# Altium footprint library Connectors.PcbLib: 87 footprints (part 6 of 6)
Each footprint in its own frame and in the unit in brackets; x right, y up, seen from the top. Pads: shape width x height; smd on the part's side, far side on the other; paste and mask are expansions set on the pad; w line width, h text height; cw(c..) or ccw(c..) is an arc to the next point about the centre after c.
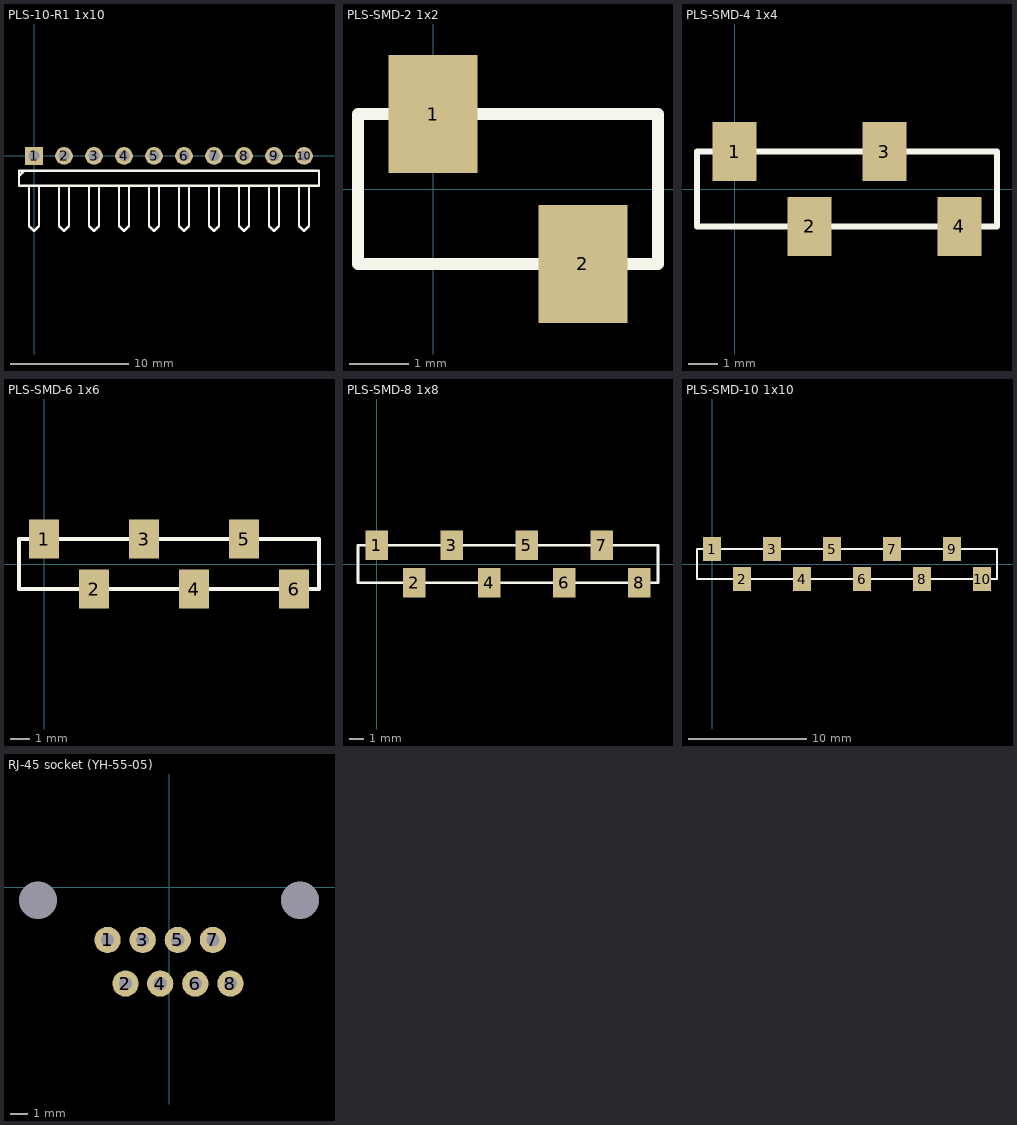
[diagram p5: the footprints below, top view; thin cyan lines are the x and y axes]

## PLS-10-R1 1x10 [mm]
pads (10):
  rect 1.5x1.5 hole 0.9: 1(0,0)
  round 1.5 hole 0.9: 2(2.54,0) 3(5.08,0) 4(7.62,0) 5(10.16,0) 6(12.7,0) 7(15.24,0) 8(17.78,0) 9(20.32,0) 10(22.86,0)
Top Overlay:
  lines w0.2: -1.27,-1.693 -0.847,-1.27 ; -0.423,-2.54 -0.423,-5.927 0,-6.35 0.423,-5.927 0.423,-2.54 ; 2.117,-2.54 2.117,-5.927 2.54,-6.35 2.963,-5.927 2.963,-2.54 ; 4.657,-2.54 4.657,-5.927 5.08,-6.35 5.503,-5.927 5.503,-2.54 ; 7.197,-2.54 7.197,-5.927 7.62,-6.35 8.043,-5.927 8.043,-2.54 ; 9.737,-2.54 9.737,-5.927 10.16,-6.35 10.583,-5.927 10.583,-2.54 ; 12.277,-2.54 12.277,-5.927 12.7,-6.35 13.123,-5.927 13.123,-2.54 ; 14.817,-2.54 14.817,-5.927 15.24,-6.35 15.663,-5.927 15.663,-2.54 ; 17.357,-2.54 17.357,-5.927 17.78,-6.35 18.203,-5.927 18.203,-2.54 ; 19.897,-2.54 19.897,-5.927 20.32,-6.35 20.743,-5.927 20.743,-2.54 ; 22.437,-2.54 22.437,-5.927 22.86,-6.35 23.283,-5.927 23.283,-2.54 ; -1.27,-2.54 -1.27,-1.27 0.635,-1.27 24.13,-1.27 24.13,-2.54 -1.27,-2.54
3D body "User Library-PLS-10R gold.step": height 5.46, standoff -2.99, extent -1.27,-7.35 24.13,1.27

## PLS-SMD-2 1x2 [mm]
pads (2):
  rect 1.5x2 smd: 1(0,1.27) 2(2.54,-1.27)
Top Overlay:
  lines w0.2: -1.27,-1.27 3.81,-1.27 3.81,1.27 -1.27,1.27 -1.27,-1.27

## PLS-SMD-4 1x4 [mm]
pads (4):
  rect 1.5x2 smd: 1(0,1.27) 2(2.54,-1.27) 3(5.08,1.27) 4(7.62,-1.27)
Top Overlay:
  lines w0.2: -1.27,-1.27 8.89,-1.27 8.89,1.27 -1.27,1.27 -1.27,-1.27
3D body "pcb_connector_800-80-004-30-001101.STEP": height 9.75, standoff 0.05, extent -1.27,-2.2 8.89,2.2

## PLS-SMD-6 1x6 [mm]
pads (6):
  rect 1.5x2 smd: 1(0,1.27) 2(2.54,-1.27) 3(5.08,1.27) 4(7.62,-1.27) 5(10.16,1.27) 6(12.7,-1.27)
Top Overlay:
  lines w0.2: -1.27,-1.27 13.97,-1.27 13.97,1.27 -1.27,1.27 -1.27,-1.27
3D body "pcb_connector_800-80-006-30-001101.STEP": height 9.65, standoff -0.05, extent -1.27,-2.2 13.97,2.2

## PLS-SMD-8 1x8 [mm]
pads (8):
  rect 1.5x2 smd: 1(0,1.27) 2(2.54,-1.27) 3(5.08,1.27) 4(7.62,-1.27) 5(10.16,1.27) 6(12.7,-1.27) 7(15.24,1.27) 8(17.78,-1.27)
Top Overlay:
  lines w0.2: -1.27,-1.27 -1.27,1.27 19.05,1.27 19.05,-1.27 -1.27,-1.27
3D body "pcb_connector_800-80-008-30-001101.STEP": height 9.75, standoff 0.05, extent -1.27,-2.2 19.05,2.2

## PLS-SMD-10 1x10 [mm]
pads (10):
  rect 1.5x2 smd: 1(0,1.27) 2(2.54,-1.27) 3(5.08,1.27) 4(7.62,-1.27) 5(10.16,1.27) 6(12.7,-1.27) 7(15.24,1.27) 8(17.78,-1.27) 9(20.32,1.27) 10(22.86,-1.27)
Top Overlay:
  lines w0.2: -1.27,-1.27 -1.27,1.27 24.13,1.27 24.13,-1.27 -1.27,-1.27
3D body "pcb_connector_800-80-004-30-001101.STEP": height 9.65, standoff -0.05, extent -1.27,-2.2 8.89,2.2
3D body "pcb_connector_800-80-006-30-001101.STEP": height 9.65, standoff -0.05, extent 8.89,-2.2 24.13,2.2

## RJ-45 socket (YH-55-05) [mil]
pads (10):
  round 60 hole 30: 1(-140.55,-120.87) 2(-99.61,-220.87) 3(-60.24,-120.87) 4(-20.08,-220.87) 5(20.08,-120.87) 6(60.24,-220.87) 7(100.39,-120.87) 8(140.55,-220.87)
  round 0 hole 86.61: ""(-300,-30) ""(300,-30)
3D body "User Library-RJ45 Connector.step": height 569.4, standoff -164.86, extent -342.52,-311.81 342.52,200